# Altium footprint library AD_Lib.PcbLib: 508 footprints (part 8 of 32)
Each footprint in its own frame and in the unit in brackets; x right, y up, seen from the top. Pads: shape width x height; smd on the part's side, far side on the other; paste and mask are expansions set on the pad; w line width, h text height; cw(c..) or ccw(c..) is an arc to the next point about the centre after c.
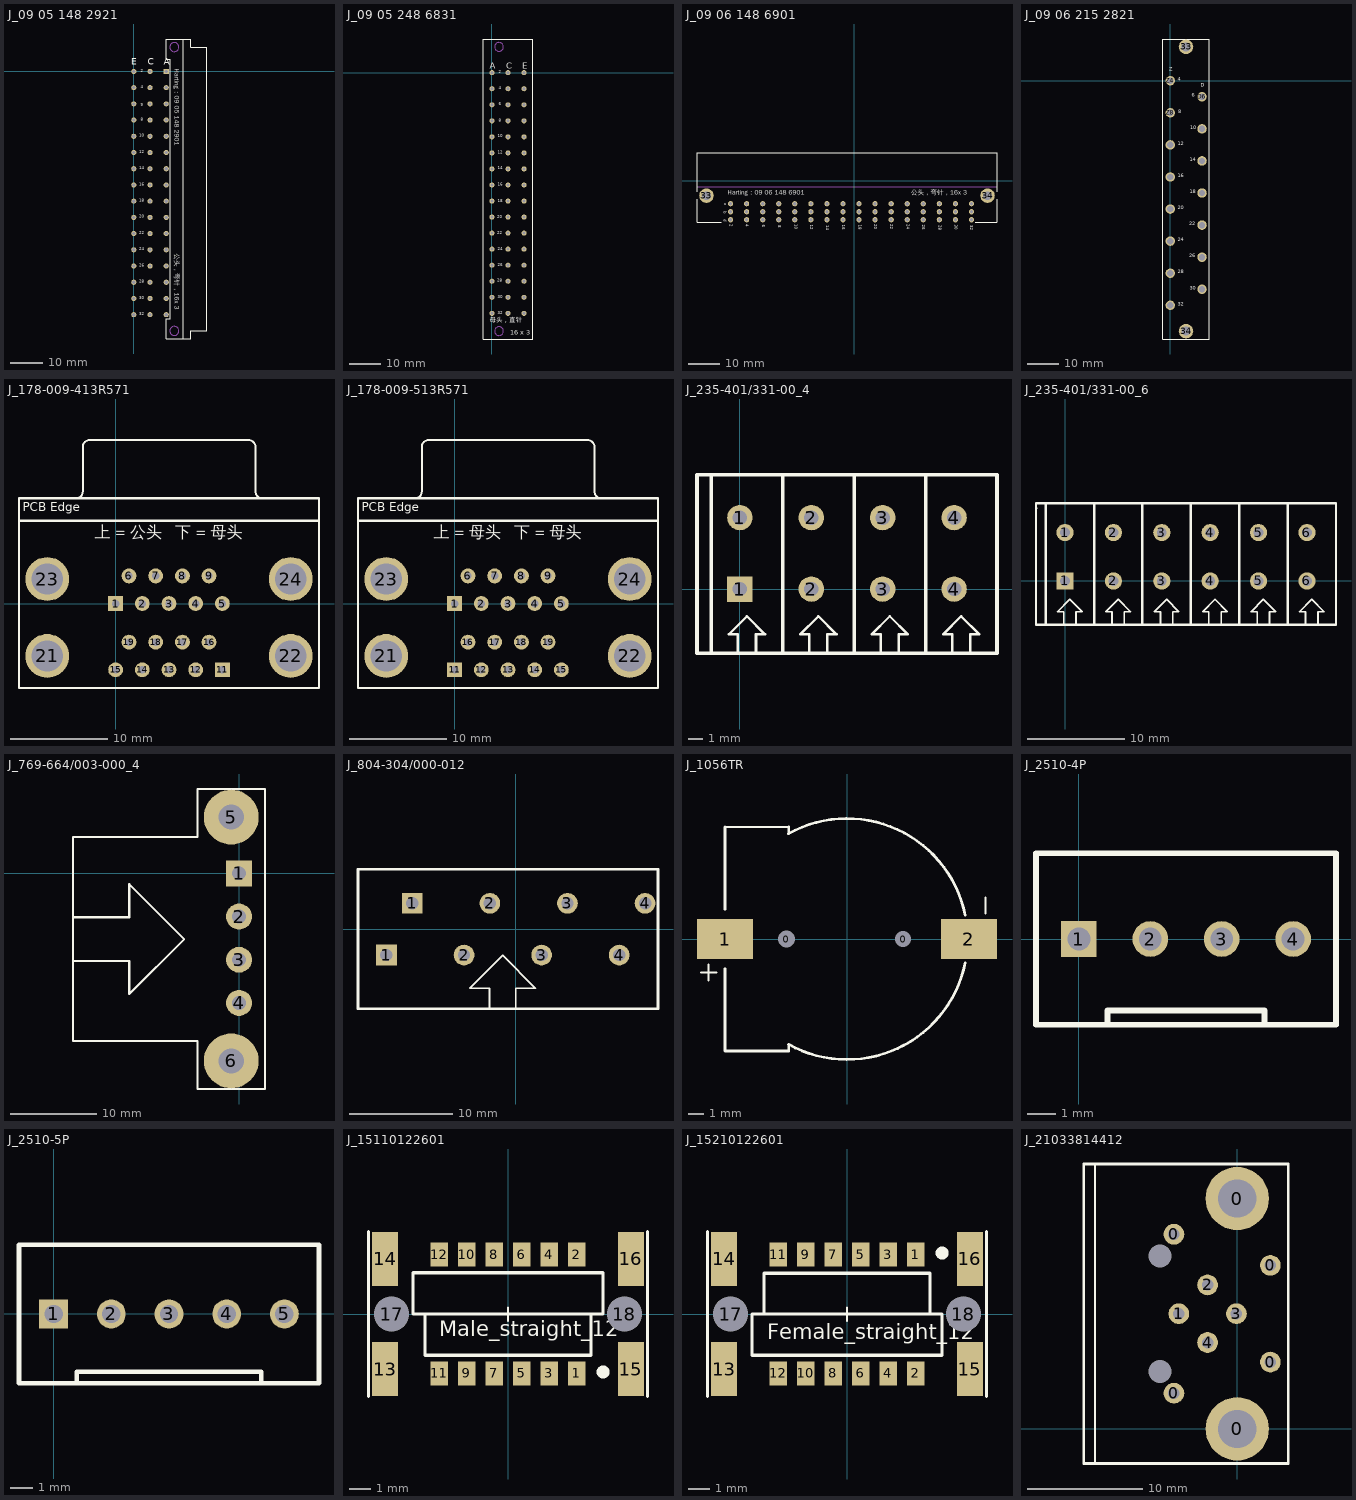
[diagram p7: the footprints below, top view; thin cyan lines are the x and y axes]

## J_09 05 148 2921 [mm]
pads (48):
  rect 1.6x1.6 hole 1: A2(10.16,0)
  round 1.6 hole 1: A4(10.16,-5.08) A6(10.16,-10.16) A8(10.16,-15.24) A10(10.16,-20.32) A12(10.16,-25.4) A14(10.16,-30.48) A16(10.16,-35.56) A18(10.16,-40.64) A20(10.16,-45.72) A22(10.16,-50.8) A24(10.16,-55.88) A26(10.16,-60.96) A28(10.16,-66.04) A30(10.16,-71.12) A32(10.16,-76.2) C2(5.08,0) C4(5.08,-5.08) C6(5.08,-10.16) C8(5.08,-15.24) C10(5.08,-20.32) C12(5.08,-25.4) C14(5.08,-30.48) C16(5.08,-35.56) C18(5.08,-40.64) C20(5.08,-45.72) C22(5.08,-50.8) C24(5.08,-55.88) C26(5.08,-60.96) C28(5.08,-66.04) C30(5.08,-71.12) C32(5.08,-76.2) E2(0,0) E4(0,-5.08) E6(0,-10.16) E8(0,-15.24) E10(0,-20.32) E12(0,-25.4) E14(0,-30.48) E16(0,-35.56) E18(0,-40.64) E20(0,-45.72) E22(0,-50.8) E24(0,-55.88) E26(0,-60.96) E28(0,-66.04) E30(0,-71.12) E32(0,-76.2)
Top Overlay:
  lines w0.254: 15.46,-83.82 15.46,10.16 ; 10.16,-83.82 10.16,-77.47 11.43,-77.47 11.43,3.81 10.16,3.81 10.16,10.16 17.78,10.16 17.78,7.62 22.86,7.62 22.86,-81.28 17.78,-81.28 17.78,-83.82 10.16,-83.82
  text "A" at 9.398,1.27 h3.56
  text "C" at 4.318,1.27 h3.56
  text "E" at -0.762,1.27 h3.56
  text "Harting：09 05 148 2901" at 12.259,0.914 h2.54
  text "公头，弯针，16x 3" at 12.234,-57.15 h2.54
  text "2" at 2.235,-0.508 h1.52
  text "4" at 2.235,-5.588 h1.52
  text "6" at 2.997,-9.652 h1.52
  text "8" at 2.235,-15.748 h1.52
  text "10" at 1.778,-20.828 h1.52
  text "12" at 1.778,-25.908 h1.52
  text "14" at 1.778,-30.988 h1.52
  text "16" at 1.778,-36.068 h1.52
  text "18" at 1.778,-41.148 h1.52
  text "20" at 1.778,-46.228 h1.52
  text "22" at 1.778,-51.308 h1.52
  text "24" at 1.778,-56.388 h1.52
  text "26" at 1.778,-61.468 h1.52
  text "28" at 1.778,-66.548 h1.52
  text "30" at 1.778,-71.628 h1.52
  text "32" at 1.778,-76.708 h1.52
Bottom Overlay:
  text "E" at 0.508,1.27 h3.56
  text "C" at 5.842,1.27 h3.56
  text "A" at 10.922,1.27 h3.56
  text "8" at 2.997,-15.748 h1.52
  text "2" at 2.997,-0.508 h1.52
  text "4" at 2.997,-5.588 h1.52
  text "6" at 2.997,-10.668 h1.52
  text "10" at 3.251,-20.828 h1.52
  text "12" at 3.251,-25.908 h1.52
  text "14" at 3.251,-30.988 h1.52
  text "16" at 3.251,-36.068 h1.52
  text "18" at 3.251,-41.148 h1.52
  text "20" at 3.251,-46.228 h1.52
  text "22" at 3.251,-51.308 h1.52
  text "24" at 3.251,-56.388 h1.52
  text "26" at 3.251,-61.468 h1.52
  text "28" at 3.251,-66.548 h1.52
  text "30" at 3.251,-71.628 h1.52
  text "32" at 3.251,-76.708 h1.52
Mechanical 1:
  circle w0.254: c12.7,7.62 r1.4
  circle w0.254: c12.7,-81.28 r1.4

## J_09 05 248 6831 [mm] "哈丁背板接头，公母头，48P"
height 11.55
pads (48):
  round 1.6 hole 1: A2(0,0) A4(0,-5.08) A6(0,-10.16) A8(0,-15.24) A10(0,-20.32) A12(0,-25.4) A14(0,-30.48) A16(0,-35.56) A18(0,-40.64) A20(0,-45.72) A22(0,-50.8) A24(0,-55.88) A26(0,-60.96) A28(0,-66.04) A30(0,-71.12) A32(0,-76.2) C2(5.08,0) C4(5.08,-5.08) C6(5.08,-10.16) C8(5.08,-15.24) C10(5.08,-20.32) C12(5.08,-25.4) C14(5.08,-30.48) C16(5.08,-35.56) C18(5.08,-40.64) C20(5.08,-45.72) C22(5.08,-50.8) C24(5.08,-55.88) C26(5.08,-60.96) C28(5.08,-66.04) C30(5.08,-71.12) C32(5.08,-76.2) E2(10.16,0) E4(10.16,-5.08) E6(10.16,-10.16) E8(10.16,-15.24) E10(10.16,-20.32) E12(10.16,-25.4) E14(10.16,-30.48) E16(10.16,-35.56) E18(10.16,-40.64) E20(10.16,-45.72) E22(10.16,-50.8) E24(10.16,-55.88) E26(10.16,-60.96) E28(10.16,-66.04) E30(10.16,-71.12) E32(10.16,-76.2)
Top Overlay:
  lines w0.254: -2.72,-84.33 -2.72,10.67 12.88,10.67 12.88,-84.33 -2.72,-84.33
  text "母头，直针" at -0.635,-79.71 h2.54
  text "16 x 3" at 5.842,-83.693 h2.54
  text "A" at -0.68,1.3 h2
  text "C" at 4.48,1.3 h2
  text "E" at 9.64,1.2 h2
  text "2" at 2.206,-0.533 h1.52
  text "4" at 2.193,-5.613 h1.52
  text "6" at 2.193,-10.693 h1.52
  text "8" at 2.159,-15.875 h1.52
  text "10" at 1.778,-20.828 h1.52
  text "12" at 1.778,-25.908 h1.52
  text "14" at 1.812,-30.886 h1.52
  text "16" at 1.778,-36.195 h1.52
  text "18" at 1.778,-41.275 h1.52
  text "20" at 1.651,-46.355 h1.52
  text "22" at 1.651,-51.435 h1.52
  text "24" at 1.778,-56.515 h1.52
  text "26" at 1.778,-61.595 h1.52
  text "28" at 1.685,-66.573 h1.52
  text "30" at 1.812,-71.78 h1.52
  text "32" at 1.778,-76.835 h1.52
Bottom Overlay:
  lines w0.254: -2.72,-84.33 -2.72,10.67 12.88,10.67 12.88,-84.33 -2.72,-84.33
  text "E" at 10.659,1.168 h2
  text "C" at 5.96,1.295 h2
  text "A" at 0.88,1.295 h2
  text "8" at 2.828,-15.9 h1.52
  text "2" at 2.934,-0.508 h1.52
  text "4" at 2.955,-5.613 h1.52
  text "6" at 2.794,-10.668 h1.52
  text "10" at 3.082,-20.853 h1.52
  text "12" at 3.082,-25.933 h1.52
  text "14" at 3.082,-30.886 h1.52
  text "16" at 3.082,-36.22 h1.52
  text "18" at 3.082,-41.3 h1.52
  text "20" at 3.082,-46.38 h1.52
  text "22" at 3.082,-51.46 h1.52
  text "24" at 3.082,-56.54 h1.52
  text "26" at 3.209,-61.62 h1.52
  text "28" at 3.082,-66.573 h1.52
  text "30" at 3.175,-71.755 h1.52
  text "32" at 3.209,-76.86 h1.52
Mechanical 1:
  circle w0.254: c2.24,8.17 r1.4
  circle w0.254: c2.24,-81.83 r1.4

## J_09 06 148 6901 [mm] "哈丁背板接头，公头，48P"
height 9.25
pads (50):
  round 4.6 hole 2.8: 33(-46.711,-4.69) 34(42.189,-4.69)
  round 1.65 hole 1: B2(-39.091,-9.77) B4(-34.011,-9.77) B6(-28.931,-9.77) B8(-23.851,-9.77) B10(-18.771,-9.77) B12(-13.691,-9.77) B14(-8.611,-9.77) B16(-3.531,-9.77) B18(1.549,-9.77) B20(6.629,-9.77) B22(11.709,-9.77) B24(16.789,-9.77) B26(21.869,-9.77) B28(26.949,-9.77) B30(32.029,-9.77) B32(37.109,-9.77) D2(-39.091,-12.31) D4(-34.011,-12.31) D6(-28.931,-12.31) D8(-23.851,-12.31) D10(-18.771,-12.31) D12(-13.691,-12.31) D14(-8.611,-12.31) D16(-3.531,-12.31) D18(1.549,-12.31) D20(6.629,-12.31) D22(11.709,-12.31) D24(16.789,-12.31) D26(21.869,-12.31) D28(26.949,-12.31) D30(32.029,-12.31) D32(37.109,-12.31) Z2(-39.091,-7.23) Z4(-34.011,-7.23) Z6(-28.931,-7.23) Z8(-23.851,-7.23) Z10(-18.771,-7.23) Z12(-13.691,-7.23) Z14(-8.611,-7.23) Z16(-3.531,-7.23) Z18(1.549,-7.23) Z20(6.629,-7.23) Z22(11.709,-7.23) Z24(16.789,-7.23) Z26(21.869,-7.23) Z28(26.949,-7.23) Z30(32.029,-7.23) Z32(37.109,-7.23)
Top Overlay:
  lines w0.2: -49.711,-5.89 -49.711,-13.13 -41.961,-13.13 ; -49.71,-3.49 -49.71,8.97 45.189,8.97 45.189,-3.49 ; 38.334,-13.13 45.189,-13.13 45.189,-5.89
  text "Harting：09 06 148 6901" at -40.005,-5.08 h2.54
  text "2" at -39.624,-13.741 h1.52
  text "d" at -41.529,-12.217 h1.52
  text "b" at -41.529,-9.677 h1.52
  text "z" at -41.402,-7.01 h1.52
  text "4" at -34.544,-13.741 h1.52
  text "6" at -29.337,-13.868 h1.52
  text "8" at -24.384,-13.995 h1.52
  text "10" at -19.177,-13.741 h1.52
  text "12" at -14.224,-13.868 h1.52
  text "14" at -9.144,-13.995 h1.52
  text "16" at -4.064,-13.868 h1.52
  text "18" at 1.143,-13.868 h1.52
  text "20" at 5.969,-13.741 h1.52
  text "22" at 11.176,-13.741 h1.52
  text "24" at 16.256,-13.741 h1.52
  text "26" at 21.209,-13.868 h1.52
  text "28" at 26.416,-14.122 h1.52
  text "30" at 31.496,-13.868 h1.52
  text "32" at 36.449,-14.122 h1.52
  text "公头，弯针，16x 3" at 18.059,-5.105 h2.54
Bottom Overlay:
  text "8" at -24.257,-14.503 h1.52
  text "2" at -39.497,-14.63 h1.52
  text "z" at -41.402,-7.518 h1.52
  text "b" at -41.529,-9.931 h1.52
  text "d" at -41.529,-12.725 h1.52
  text "4" at -34.544,-14.503 h1.52
  text "6" at -29.464,-14.503 h1.52
  text "10" at -19.304,-15.392 h1.52
  text "12" at -14.224,-15.392 h1.52
  text "14" at -9.144,-15.265 h1.52
  text "16" at -3.937,-15.392 h1.52
  text "18" at 1.143,-15.392 h1.52
  text "20" at 6.223,-15.519 h1.52
  text "22" at 11.43,-15.519 h1.52
  text "24" at 16.51,-15.519 h1.52
  text "26" at 21.336,-15.519 h1.52
  text "28" at 26.416,-15.519 h1.52
  text "30" at 31.496,-15.519 h1.52
  text "32" at 36.703,-15.392 h1.52
Mechanical 1:
  lines w0.1: -49.711,-1.93 45.189,-1.93
  text "PCB Edge" at -48.731,-1.43 h1.52

## J_09 06 215 2821 [mm]
height 1.6
pads (17):
  round 4.6 hole 2.8: 33(4.98,10.71) 34(4.98,-79.29)
  round 3 hole 2: D6(10.06,-5.08) D10(10.06,-15.24) D14(10.06,-25.4) D18(10.06,-35.56) D22(10.06,-45.72) D26(10.06,-55.88) D30(10.06,-66.04) Z4(0,0) Z8(0,-10.16) Z12(0,-20.32) Z16(0,-30.48) Z20(0,-40.64) Z24(0,-50.8) Z28(0,-60.96) Z32(0,-71.12)
Top Overlay:
  lines w0.203: -2.42,-81.79 12.38,-81.79 12.38,13.21 -2.42,13.21 -2.42,-81.79
  text "32" at 2.44,-71.67 h2.03
  text "30" at 6.123,-66.59 h2.03
  text "28" at 2.44,-61.51 h2.03
  text "26" at 5.996,-56.43 h2.03
  text "24" at 2.44,-51.35 h2.03
  text "22" at 5.996,-46.27 h2.03
  text "20" at 2.44,-41.19 h2.03
  text "18" at 6.123,-36.11 h2.03
  text "16" at 2.44,-31.03 h2.03
  text "14" at 6.123,-25.95 h2.03
  text "12" at 2.44,-20.87 h2.03
  text "10" at 6.25,-15.79 h2.03
  text "8" at 2.567,-10.71 h2.03
  text "6" at 6.758,-5.63 h2.03
  text "4" at 2.44,-0.55 h2.03
  text "Z" at -0.354,2.625 h2.03
  text "D" at 9.679,-2.455 h2.03
Bottom Overlay:
  text "4" at 3.202,-0.55 h2.03
  text "6" at 7.52,-5.63 h2.03
  text "20" at 3.837,-41.19 h2.03
  text "22" at 7.52,-46.27 h2.03
  text "24" at 3.837,-51.35 h2.03
  text "26" at 7.52,-56.43 h2.03
  text "28" at 3.964,-61.51 h2.03
  text "32" at 3.964,-71.67 h2.03
  text "30" at 7.647,-66.59 h2.03
  text "18" at 7.647,-36.11 h2.03
  text "16" at 3.837,-31.03 h2.03
  text "14" at 7.647,-25.95 h2.03
  text "12" at 3.837,-20.87 h2.03
  text "10" at 7.647,-15.79 h2.03
  text "8" at 3.202,-10.71 h2.03
  text "D" at 10.441,-2.455 h2.03
  text "Z" at 0.535,2.625 h2.03

## J_178-009-413R571 [mil] "Dual Port D-SUB plug"
height 909.45
pads (22):
  rect 60x60 hole 30: 1(0,0) 11(431.5,-267.72)
  round 60 hole 30: 2(107.87,0) 3(215.75,0) 4(323.62,0) 5(431.5,0) 6(53.94,111.81) 7(161.81,111.81) 8(270,111.81) 9(377.56,111.81) 12(323.62,-267.72) 13(215.75,-267.72) 14(107.87,-267.72) 15(0,-267.72) 16(377.56,-155.91) 17(270,-155.91) 18(161.81,-155.91) 19(53.94,-155.91)
  round 177.17 hole 125.98: 21(-276.38,-211.81) 22(707.87,-211.81) 23(-276.38,99.21) 24(707.87,99.21)
Top Overlay:
  lines w7.87: -160.08,425.12 ccw(c-160.08,452.48) -132.72,452.48 -132.72,633.58 ; -132.52,633.78 cw(c-105.16,633.78) -105.16,661.14 537.76,661.14 cw(c537.76,633.78) 565.12,633.78 ; 565.32,633.58 565.32,452.48 ccw(c592.68,452.48) 592.68,425.12
  lines w10: -390.55,333.86 822.05,333.86 ; -390.55,-341.34 -390.55,426.38 822.05,426.38 822.05,-341.34 -390.55,-341.34
  text "上 = 公头" at -84.25,250 h80
  text "PCB Edge" at -375,360 h60
  text "下 = 母头" at 240.75,250 h80
Bottom Overlay:
  lines w6: -84.25,-340 515.75,-340 515.75,-100 -84.25,-100 -84.25,-340 ; -84.25,0 ccw(c-34.25,0) -34.25,-50 465.75,-50 ccw(c465.75,0) 515.75,0 515.75,150 ccw(c465.75,150) 465.75,200 -34.25,200 ccw(c-34.25,150) -84.25,150 -84.25,0
  text "F" at 500,100 h100
  text "M" at 500,-175 h100
  text "1" at 10,40 h60
  text "2" at 117.87,40 h60
  text "3" at 225.75,40 h60
  text "4" at 333.62,40 h60
  text "5" at 441.5,40 h60
  text "9" at 387.56,151.81 h60
  text "8" at 280,151.81 h60
  text "7" at 171.81,151.81 h60
  text "6" at 63.94,151.81 h60
  text "5" at 10,-227.72 h60
  text "4" at 117.87,-227.72 h60
  text "3" at 225.75,-227.72 h60
  text "2" at 333.62,-227.72 h60
  text "1" at 441.5,-227.72 h60
  text "9" at 10,-175 h60

## J_178-009-513R571 [mil] "Dual Port D-SUB plug upper -socket bottom"
height 909.45
pads (22):
  rect 60x60 hole 30: 1(0,0) 11(0,-267.72)
  round 60 hole 30: 2(107.87,0) 3(215.75,0) 4(323.62,0) 5(431.5,0) 6(53.94,111.81) 7(161.81,111.81) 8(270,111.81) 9(377.56,111.81) 12(107.87,-267.72) 13(215.75,-267.72) 14(323.62,-267.72) 15(431.5,-267.72) 16(53.94,-155.91) 17(161.81,-155.91) 18(270,-155.91) 19(377.56,-155.91)
  round 177.17 hole 125.98: 21(-276.38,-211.81) 22(707.87,-211.81) 23(-276.38,99.21) 24(707.87,99.21)
Top Overlay:
  lines w7.87: -160.08,425.12 ccw(c-160.08,452.48) -132.72,452.48 -132.72,633.58 ; -132.52,633.78 cw(c-105.16,633.78) -105.16,661.14 537.76,661.14 cw(c537.76,633.78) 565.12,633.78 ; 565.32,633.58 565.32,452.48 ccw(c592.68,452.48) 592.68,425.12
  lines w10: -390.55,333.86 822.05,333.86 ; -390.55,-341.34 822.05,-341.34 822.05,426.38 -390.55,426.38 -390.55,-341.34
  text "下 = 母头" at 240.75,250 h80
  text "PCB Edge" at -375,360 h60
  text "上 = 母头" at -84.25,250 h80
Bottom Overlay:
  lines w6: -84.25,-267.72 ccw(c-34.25,-267.72) -34.25,-317.72 465.75,-317.72 ccw(c465.75,-267.72) 515.75,-267.72 515.75,-117.72 ccw(c465.75,-117.72) 465.75,-67.72 -34.25,-67.72 ccw(c-34.25,-117.72) -84.25,-117.72 -84.25,-267.72 ; -84.25,0 ccw(c-34.25,0) -34.25,-50 465.75,-50 ccw(c465.75,0) 515.75,0 515.75,150 ccw(c465.75,150) 465.75,200 -34.25,200 ccw(c-34.25,150) -84.25,150 -84.25,0
  text "6" at 63.94,-115.91 h60
  text "7" at 171.81,-115.91 h60
  text "8" at 280,-115.91 h60
  text "9" at 387.56,-115.91 h60
  text "5" at 441.5,-227.72 h60
  text "4" at 333.62,-227.72 h60
  text "3" at 225.75,-227.72 h60
  text "2" at 117.87,-227.72 h60
  text "1" at 10,-227.72 h60
  text "6" at 63.94,151.81 h60
  text "7" at 171.81,151.81 h60
  text "8" at 280,151.81 h60
  text "9" at 387.56,151.81 h60
  text "5" at 441.5,40 h60
  text "4" at 333.62,40 h60
  text "3" at 225.75,40 h60
  text "2" at 117.87,40 h60
  text "1" at 10,40 h60
  text "F" at 490.75,-200 h100
  text "F" at 490.75,75 h100

## J_235-401/331-00_4 [mm] "WAGO之PCB接线端子，拼接式，4极"
height 15.5
pads (8):
  rect 1.778x1.778 hole 1: 1(0,0)
  round 1.778 hole 1: 1(0,5) 2(5,0) 2(5,5) 3(10,0) 3(10,5) 4(15,0) 4(15,5)
Top Overlay:
  lines w0.178: -0.141,-4.5 -0.141,-3.175 -0.776,-3.175 0.494,-1.905 1.764,-3.175 1.129,-3.175 1.129,-4.5 ; 4.859,-4.5 4.859,-3.175 4.224,-3.175 5.494,-1.905 6.764,-3.175 6.129,-3.175 6.129,-4.5 ; 9.859,-4.5 9.859,-3.175 9.224,-3.175 10.494,-1.905 11.764,-3.175 11.129,-3.175 11.129,-4.5 ; 14.859,-4.5 14.859,-3.175 14.224,-3.175 15.494,-1.905 16.764,-3.175 16.129,-3.175 16.129,-4.5
  lines w0.254: -3,7.486 -2.986,7.5 ; -3,8 -3,-4.5 -2,-4.5 ; -3,8.008 18,8.008 ; -2,8.008 -2,-4.5 ; 3,-4.5 3,8 ; 8,-4.5 8,8 ; 13,-4.5 13,8 ; 18,8 18,-4.5 -2,-4.5

## J_235-401/331-00_6 [mm] "WAGO之PCB接线端子，拼接式，6极"
height 15.5
pads (12):
  rect 1.778x1.778 hole 1: 1(0,0)
  round 1.778 hole 1: 1(0,5) 2(5,0) 2(5,5) 3(10,0) 3(10,5) 4(15,0) 4(15,5) 5(20,0) 5(20,5) 6(25,0) 6(25,5)
Top Overlay:
  lines w0.178: -0.141,-4.5 -0.141,-3.175 -0.776,-3.175 0.494,-1.905 1.764,-3.175 1.129,-3.175 1.129,-4.5 ; 4.859,-4.5 4.859,-3.175 4.224,-3.175 5.494,-1.905 6.764,-3.175 6.129,-3.175 6.129,-4.5 ; 9.859,-4.5 9.859,-3.175 9.224,-3.175 10.494,-1.905 11.764,-3.175 11.129,-3.175 11.129,-4.5 ; 14.859,-4.5 14.859,-3.175 14.224,-3.175 15.494,-1.905 16.764,-3.175 16.129,-3.175 16.129,-4.5 ; 19.859,-4.5 19.859,-3.175 19.224,-3.175 20.494,-1.905 21.764,-3.175 21.129,-3.175 21.129,-4.5 ; 24.859,-4.5 24.859,-3.175 24.224,-3.175 25.494,-1.905 26.764,-3.175 26.129,-3.175 26.129,-4.5
  lines w0.254: -3,7.486 -2.986,7.5 ; -3,8 -3,-4.5 -2,-4.5 ; -3,8.008 28,8.008 ; -2,8.008 -2,-4.5 ; 3,-4.5 3,8 ; 8,-4.5 8,8 ; 13,-4.5 13,8 ; 18,-4.5 18,8.008 ; 23,-4.5 23,8 ; 28,7.873 28,-4.5 -2,-4.5

## J_769-664/003-000_4 [mm] "WAGO之大电流端子"
height 18.3
pads (6):
  rect 2.997x2.997 / inner round 1.524 / far side round 1.524 hole 1.6: 1(0,0)
  round 2.997 hole 1.6: 2(0,-5) 3(0,-10) 4(0,-15)
  round 6.35 hole 2.9: 5(-0.9,6.5) 6(-0.9,-21.7)
Top Overlay:
  lines w0.254: -19.2,-10.16 -12.7,-10.16 -12.7,-13.97 -6.35,-7.62 -12.7,-1.27 -12.7,-5.08 -19.2,-5.08 ; -19.2,-19.4 -19.2,4.2 -4.8,4.2 -4.8,9.75 3,9.75 3,-24.95 -4.8,-24.95 -4.8,-19.4 -19.2,-19.4

## J_804-304/000-012 [mm] "WAGO；带弹簧卡子；引脚间距7.5mm；4极"
height 14.4
pads (8):
  rect 2x2 hole 1.2: 1(-12.5,-2.5) 1(-10,2.5)
  round 2 hole 1.2: 2(-5,-2.5) 2(-2.5,2.5) 3(2.5,-2.5) 3(5,2.5) 4(10,-2.5) 4(12.5,2.5)
Top Overlay:
  lines w0.178: -2.54,-7.7 -2.54,-5.715 -4.445,-5.715 -1.27,-2.54 1.905,-5.715 0,-5.715 0,-7.7
  lines w0.254: -15.25,-7.7 13.75,-7.7 13.75,5.8 -15.25,5.8 -15.25,-7.7
Bottom Overlay:
  text "4" at 10.922,-6.985 h4
  text "3" at 3.302,-6.985 h4
  text "2" at -4.318,-6.985 h4
  text "1" at -11.811,-6.858 h4

## J_1056TR [mm] "锂电池基座，对应锂电池CR1220"
height 5.6
pads (4):
  round 0.8 hole 1.1 unplated mask+0.102: 0(-3.9,0)
  round 0.8 hole 1 unplated mask+0.102: 0(3.6,0)
  rect 3.607x2.591 smd: 1(-7.836,0) 2(7.836,0)
Top Overlay:
  lines w0.127: -9.398,-2.159 -8.382,-2.159 ; -8.89,-2.667 -8.89,-1.651 ; -7.836,7.201 -3.746,7.201 ; 8.89,1.651 8.89,2.667
  lines w0.178: -7.836,-1.905 -7.836,-7.201 -3.746,-7.201 -3.746,-6.769 ; -7.836,1.905 -7.836,7.201 ; -3.768,6.769 cw(c0,0) 7.597,1.519 ; -3.751,-6.778 ccw(c0,0) 7.597,-1.519 ; -3.746,6.769 -3.746,7.201

## J_2510-4P [mil] "接插件"
pads (4):
  rect 50x50 hole 32: 1(0,0)
  round 50 hole 32: 2(100,0) 3(200,0) 4(300,0)
Top Overlay:
  lines w8: 40,-120 40,-100 260,-100 260,-120 ; -60,-120 360,-120 360,120 -60,120 -60,-120

## J_2510-5P [mil] "接插件"
pads (5):
  rect 50x50 hole 32: 1(0,0)
  round 50 hole 32: 2(100,0) 3(200,0) 4(300,0) 5(400,0)
Top Overlay:
  lines w8: 40,-120 40,-100 360,-100 360,-120 ; -60,-120 -60,120 460,120 460,-120 -60,-120

## J_15110122601 [mm] "Har_flex_M/F_straight_12Pin"
height 1.45
pads (18):
  rect 0.8x1.1 smd mask+0.051: 1(3.175,-2.75) 2(3.175,2.75) 3(1.905,-2.75) 4(1.905,2.75) 5(0.635,-2.75) 6(0.635,2.75) 7(-0.635,-2.75) 8(-0.635,2.75) 9(-1.905,-2.75) 10(-1.905,2.75) 11(-3.175,-2.75) 12(-3.175,2.75)
  rect 1.2x2.5 smd mask+0.051: 13(-5.685,-2.55) 14(-5.685,2.55) 15(5.685,-2.55) 16(5.685,2.55)
  round 1.6 hole 1.6 unplated mask+0.102: 17(-5.385,0) 18(5.385,0)
Top Overlay:
  circle w0.3: c4.397,-2.681 r0.15
  lines w0.102: 0,-0.308 0,0.305
  lines w0.152: -6.452,-3.81 -6.452,3.81 ; -3.835,0 -3.835,-1.905 3.835,-1.905 3.835,0 ; 6.452,-3.81 6.452,3.81 ; -4.394,0 4.394,0 4.394,1.905 -4.394,1.905 -4.394,0
  text "Male_straight_12" at -3.175,-1.27 h1.2

## J_15210122601 [mm] "Har_flex_M/F_straight_12Pin"
height 1.45
pads (18):
  rect 0.8x1.1 smd mask+0.051: 1(3.175,2.75) 2(3.175,-2.75) 3(1.905,2.75) 4(1.905,-2.75) 5(0.635,2.75) 6(0.635,-2.75) 7(-0.635,2.75) 8(-0.635,-2.75) 9(-1.905,2.75) 10(-1.905,-2.75) 11(-3.175,2.75) 12(-3.175,-2.75)
  rect 1.2x2.5 smd mask+0.051: 13(-5.685,-2.55) 14(-5.685,2.55) 15(5.685,-2.55) 16(5.685,2.55)
  round 1.6 hole 1.6 unplated mask+0.102: 17(-5.385,0) 18(5.385,0)
Top Overlay:
  circle w0.3: c4.397,2.819 r0.15
  lines w0.102: 0,-0.308 0,0.305
  lines w0.152: -6.452,-3.81 -6.452,3.81 ; -3.835,0.025 -3.835,1.88 3.835,1.88 3.835,0 ; 6.452,-3.81 6.452,3.81 ; -4.394,-1.905 -4.394,0 4.394,0 4.394,-1.905 -4.394,-1.905
  text "Female_straight_12" at -3.683,-1.397 h1.2

## J_21033814412 [mm] "M12连接器"
height 14
pads (12):
  round 1.8 hole 1: 0(-5.5,3.1) 0(-5.5,16.9) 0(2.875,5.8) 0(2.875,14.2) 1(-5.075,10) 2(-2.575,12.5) 3(-0.075,10) 4(-2.575,7.5)
  round 5.5 hole 3.3: 0(0,0) 0(0,20)
  round 1.524 hole 2: ""(-6.725,5) ""(-6.725,15)
Top Overlay:
  lines w0.178: -12.34,-3.048 -12.34,23
  lines w0.254: -13.325,-3 -13.325,23 4.425,23 4.425,-3 -13.325,-3
Bottom Overlay:
  text "4" at -2.286,5.08 h1.52
  text "3" at 2.032,9.525 h1.52
  text "1" at -6.858,9.525 h1.52
  text "2" at -2.413,13.843 h1.52
Mechanical 2:
  text "PCB edge" at -11.811,22.225 h1.52